# Altium footprint library BIRD.PcbLib: 23 footprints (part 1 of 2)
Each footprint in its own frame and in the unit in brackets; x right, y up, seen from the top. Pads: shape width x height; smd on the part's side, far side on the other; paste and mask are expansions set on the pad; w line width, h text height; cw(c..) or ccw(c..) is an arc to the next point about the centre after c.
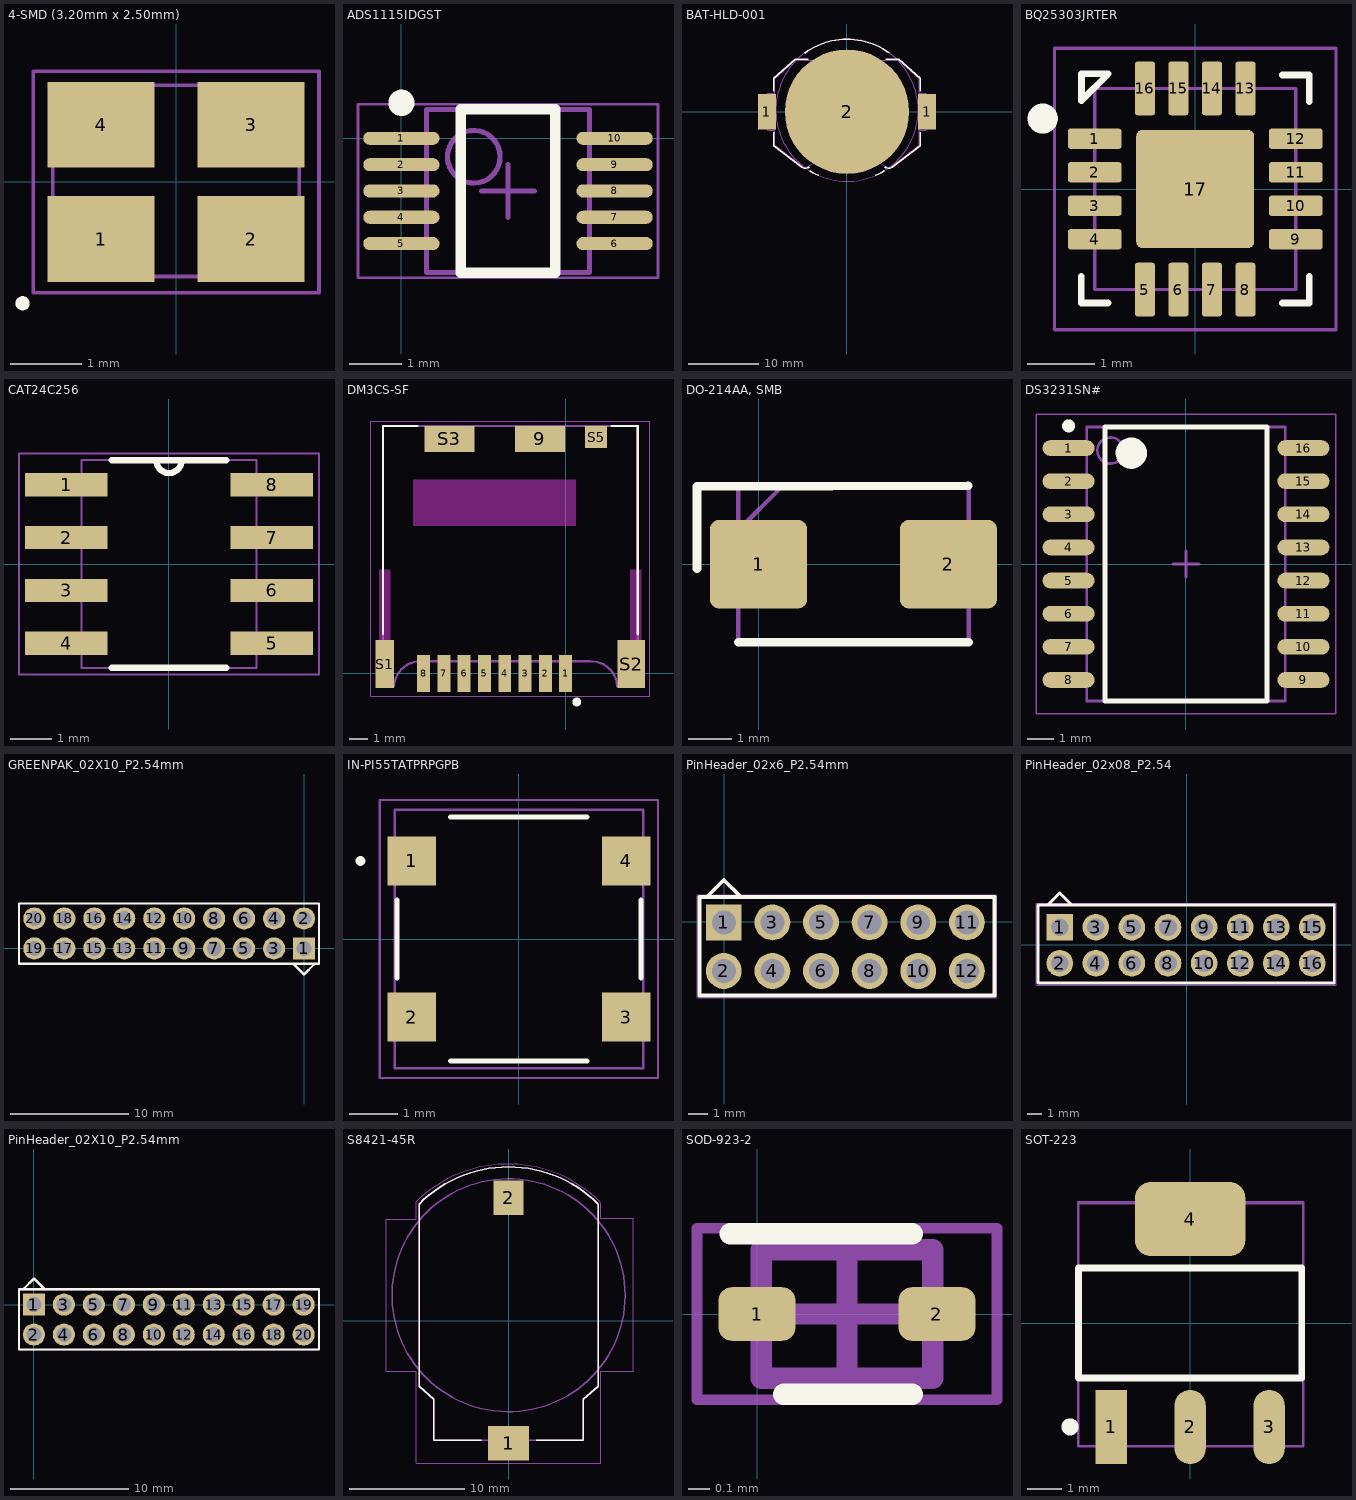
[diagram p0: the footprints below, top view; thin cyan lines are the x and y axes]

## 4-SMD (3.20mm x 2.50mm) [mm] "Crystal :  0.126\" L x 0.098\" W (3.20mm x 2.50mm)"
pads (4):
  rect 1.5x1.2 smd: 1(-1.05,-0.8) 2(1.05,-0.8) 3(1.05,0.8) 4(-1.05,0.8)
Top Overlay:
  lines w0.1: -2.15,-1.75 cw(c-2.15,-1.7) -2.15,-1.65 cw(c-2.15,-1.7) -2.15,-1.75
Mechanical 13:
  lines w0.05: -1.725,-1.325 1.725,-1.325 1.725,1.35 -1.725,1.35 -1.725,-1.325
Mechanical 15:
  lines w0.05: -2,-1.55 2,-1.55 2,1.55 -2,1.55 -2,-1.55
3D body "FL2500047.stp": height 0.88, standoff 0, extent -1.68,-1.28 1.68,1.28

## ADS1115IDGST [mm]
pads (10):
  oval 1.45x0.25 smd: 1(0,0) 2(0,-0.5) 3(0,-1) 4(0,-1.5) 5(0,-2) 6(4.05,-2) 7(4.05,-1.5) 8(4.05,-1) 9(4.05,-0.5) 10(4.05,0)
Top Overlay:
  circle w0.25: c0,0.675 r0.125
  lines w0.2: 1.125,-2.55 2.925,-2.55 2.925,0.55 1.125,0.55 1.125,-2.55
Mechanical 13:
  circle w0.1: c1.375,-0.35 r0.5
  lines w0.1: 0.475,-2.55 3.575,-2.55 3.575,0.55 0.475,0.55 0.475,-2.55
Mechanical 15:
  lines w0.05: -0.825,-2.65 4.875,-2.65 4.875,0.65 -0.825,0.65 -0.825,-2.65
  lines w0.1: 1.525,-1 2.525,-1 ; 2.025,-1.5 2.025,-0.5
3D body "ADS1115IDGST.STEP": height 1.1, standoff 0, extent -0.35,-2.5 4.55,0.5

## BAT-HLD-001 [mm] "BATT RETAINER COIN 20MM 1CEL SMD"
pads (3):
  rect 2.54x5.08 smd: 1(-11.43,0) 1(11.43,0)
  round 17.78 smd: 2(0,0)
Top Overlay:
  lines w0.2: -10.466,-2.94 -10.466,-4.853 -6.545,-7.854 ; -10.466,2.94 -10.466,4.785 -7.425,7.475 -5.515,7.476 ; -6.545,-7.854 ccw(c-5.97,-7.277) -5.561,-7.982 cw(c0.254,-19.539) -5.394,-7.899 ; -6.041,8.364 cw(c0,0.19) 5.977,8.411 ; -5.313,-8.454 ccw(c0,0.215) -4.054,-9.109 ; 4.054,-9.109 ccw(c0,0.215) 5.313,-8.454 ; 5.394,-7.899 cw(c-0.254,-19.539) 5.561,-7.982 ccw(c5.97,-7.277) 6.545,-7.854 ; 5.515,7.476 7.425,7.475 10.466,4.785 10.466,2.94 ; 6.545,-7.854 10.466,-4.853 ; 10.466,-4.852 10.466,-2.94
Mechanical 1:
  circle w0.1: c0,0.215 r10.168
Mechanical 13:
  lines w0.1: -10.326,-2.625 -11.316,-2.625 -11.316,-0.525 -10.316,-0.525 ; -10.316,0.525 -11.316,0.525 -11.316,2.625 -10.316,2.625 ; -6.038,-8.055 cw(c-0.031,-19.513) 6.013,-8.074 ; -6.038,-8.056 -10.316,-4.775 -10.316,4.725 -7.366,7.325 7.366,7.325 10.316,4.725 10.316,-4.775 6.013,-8.075 ; 10.316,-0.525 11.316,-0.525 11.316,-2.625 10.326,-2.625 ; 10.316,0.525 11.316,0.525 11.316,2.625 10.316,2.625
Mechanical 15:
  lines w0.1: -0.5,0 0.5,0 ; 0,-0.5 0,0.5
3D body: height 4, standoff 0, extent -10.148,-9.872 10.148,10.383
3D body: height 4.3, standoff 0, extent -10.317,-8.075 10.317,7.326

## BQ25303JRTER [mm] "Battery Management Standalone 1-cell 17-V, 3.0-A battery charger with JEITA battery temperature monitoring 16-WQFN -40 to 85"
pads (17):
  rrect25% 0.8x0.3 smd mask+0.05: 1(-1.5,0.75) 2(-1.5,0.25) 3(-1.5,-0.25) 4(-1.5,-0.75) 9(1.5,-0.75) 10(1.5,-0.25) 11(1.5,0.25) 12(1.5,0.75)
  rrect25% 0.3x0.8 smd mask+0.05: 5(-0.75,-1.5) 6(-0.25,-1.5) 7(0.25,-1.5) 8(0.75,-1.5) 13(0.75,1.5) 14(0.25,1.5) 15(-0.25,1.5) 16(-0.75,1.5)
  rrect10% 1.76x1.76 smd mask+0.05: 17(0,0)
Top Overlay:
  circle w0.25: c-2.275,1.05 r0.1
  lines w0.1: -1.7,-1.3 -1.7,-1.7 -1.3,-1.7 ; 1.3,-1.7 1.7,-1.7 1.7,-1.3 ; 1.3,1.7 1.7,1.7 1.7,1.3 ; -1.698,1.318 -1.698,1.718 -1.298,1.718 -1.698,1.318
Mechanical 13:
  lines w0.05: -1.5,-1.5 1.5,-1.5 1.5,1.5 -1.5,1.5 -1.5,-1.5
Mechanical 15:
  lines w0.05: -2.1,-2.1 2.1,-2.1 2.1,2.1 -2.1,2.1 -2.1,-2.1
3D body "BQ25303JRTER.stp": height 0.8, standoff 0, extent -1.5,-1.5 1.5,1.5

## CAT24C256 [mil] "The CAT24C256 is a EEPROM Serial 256-Kb I2C, internally organized as 512 pages of 64 bytes each, for a total of 32,768 bytes of 8 bits each"
pads (8):
  rect 78x22 smd: 1(-97,75) 2(-97,25) 3(-97,-25) 4(-97,-75) 5(97,-75) 6(97,-25) 7(97,25) 8(97,75)
Top Overlay:
  lines w6: -54,-98 54,-98 ; -54,98 -12,98 ; 54,98 12,98 ; -12,98 ccw(c0,98) 12,98 ; -12,98 12,98
Mechanical 13:
  lines w0: -122,-85 -79,-85 -79,-65 -122,-65 -122,-85 ; -122,-35 -79,-35 -79,-15 -122,-15 -122,-35 ; -122,15 -79,15 -79,35 -122,35 -122,15 ; -122,65 -79,65 -79,85 -122,85 -122,65 ; -12,98 ccw(c0,98) 12,98 -12,98 ; 79,-85 122,-85 122,-65 79,-65 79,-85 ; 79,-35 122,-35 122,-15 79,-15 79,-35 ; 79,15 122,15 122,35 79,35 79,15 ; 79,65 122,65 122,85 79,85 79,65
  lines w1.97: -82.68,-98.43 82.68,-98.43 82.68,98.43 -82.68,98.43 -82.68,-98.43
Mechanical 15:
  lines w1.97: -141.73,-104.33 141.73,-104.33 141.73,104.33 -141.73,104.33 -141.73,-104.33
3D body "CAT24C256WI.STEP": height 68.9, standoff 0, extent -118.11,-96.46 118.11,96.46

## DM3CS-SF [mm] "10 (8 + 2) Position Card Connector Secure Digital - microSD™ Surface Mount, Right Angle Gold"
pads (13):
  rect 0.7x2 smd: 1(0,0) 2(-1.1,0) 3(-2.2,0) 4(-3.3,0) 5(-4.4,0) 6(-5.5,0) 7(-6.6,0) 8(-7.7,0)
  rect 2.7x1.4 smd: 9(-1.4,12.7) S3(-6.3,12.7)
  rect 1x2.6 smd: S1(-9.8,0.5)
  rect 1.5x2.6 smd: S2(3.55,0.5)
  rect 1.2x1.2 smd: S5(1.65,12.8)
Top Overlay:
  circle w0.24: c0.6,-1.55 r0.12
  lines w0.127: -9.9,2.15 -9.9,13.4 -8.026,13.4 ; 2.5,13.4 3.9,13.4 3.9,2.15
Keep-Out Layer:
  region: 4.1,1.792 3.512,1.792 3.512,5.6 4.1,5.6
  region: -9.5,1.792 -10.112,1.792 -10.112,5.6 -9.5,5.6
  region: 4.1,1.794 3.509,1.794 3.509,5.6 4.1,5.6
  region: -9.5,1.792 -10.112,1.792 -10.112,5.6 -9.5,5.6
  region: 0.55,8.001 -8.253,8.001 -8.253,10.5 0.55,10.5
  region: 0.55,8 -8.251,8 -8.251,10.5 0.55,10.5
Mechanical 13:
  lines w0.127: -9.9,-0.7 -9.9,13.4 3.9,13.4 3.9,-0.7 2.8,-0.7 ccw(c1.375,-0.775) 1.3,0.65 -7.8,0.65 ccw(c-7.875,-0.775) -9.3,-0.7 -9.9,-0.7
Mechanical 15:
  lines w0.05: -10.55,-1.25 4.55,-1.25 4.55,13.65 -10.55,13.65 -10.55,-1.25
3D body "DM3CS-SF.STEP": height 2.13, standoff 0, extent -9.9,-0.525 3.9,13.575

## DO-214AA, SMB [mm]
pads (2):
  rrect20% 2.25x2.05 smd mask+0.102: 1(0,0) 2(4.4,0)
Top Overlay:
  lines w0.2: -1.425,-0.1 -1.425,1.8 4.854,1.819 ; -0.47,-1.81 4.87,-1.81
Mechanical 15:
  lines w0.1: -0.47,0.785 0.555,1.81 ; -0.47,-1.81 -0.47,1.81 4.87,1.81 4.87,-1.81 -0.47,-1.81
3D body "RBR3LB40CTBR1.stp": height 2.45, standoff 0, extent -0.42,-1.81 4.92,1.81

## DS3231SN# [mm] "Extremely Accurate I²C-Integrated RTC/TCXO/Crystal"
pads (16):
  oval 2x0.6 smd: 1(-4.5,4.445) 2(-4.5,3.175) 3(-4.5,1.905) 4(-4.5,0.635) 5(-4.5,-0.635) 6(-4.5,-1.905) 7(-4.5,-3.175) 8(-4.5,-4.445) 9(4.5,-4.445) 10(4.5,-3.175) 11(4.5,-1.905) 12(4.5,-0.635) 13(4.5,0.635) 14(4.5,1.905) 15(4.5,3.175) 16(4.5,4.445)
Top Overlay:
  circle w0.6: c-2.1,4.25 r0.3
  circle w0.25: c-4.5,5.295 r0.125
  lines w0.2: -3.1,-5.25 3.1,-5.25 3.1,5.25 -3.1,5.25 -3.1,-5.25
Mechanical 13:
  circle w0.1: c-2.9,4.35 r0.5
  lines w0.1: -3.8,-5.25 3.8,-5.25 3.8,5.25 -3.8,5.25 -3.8,-5.25
Mechanical 15:
  lines w0.05: -5.75,-5.75 5.75,-5.75 5.75,5.75 -5.75,5.75 -5.75,-5.75
  lines w0.1: -0.5,0 0.5,0 ; 0,-0.5 0,0.5
3D body "DS3231SN#.STEP": height 2.65, standoff 0, extent -5.162,-5.15 5.162,5.15

## GREENPAK_02X10_P2.54mm [mm]
pads (20):
  rect 1.875x1.875 hole 1.25: 1(0,0)
  round 1.875 hole 1.25: 2(0,2.54) 3(-2.54,0) 4(-2.54,2.54) 5(-5.08,0) 6(-5.08,2.54) 7(-7.62,0) 8(-7.62,2.54) 9(-10.16,0) 10(-10.16,2.54) 11(-12.7,0) 12(-12.7,2.54) 13(-15.24,0) 14(-15.24,2.54) 15(-17.78,0) 16(-17.78,2.54) 17(-20.32,0) 18(-20.32,2.54) 19(-22.86,0) 20(-22.86,2.54)
Top Overlay:
  lines w0.2: -0.838,-1.372 0,-2.21 0.864,-1.346 ; 1.26,-1.305 1.27,-1.305 ; 1.27,-1.305 1.27,3.81 -24.165,3.81 -24.165,-1.305 1.27,-1.305
Mechanical 15:
  lines w0.1: -24.13,-1.27 -24.13,3.81 1.27,3.81 1.27,-1.27 -24.13,-1.27
3D body "929852-01-10-RB.stp": height 8.26, standoff -3.18, extent -24.13,-1.27 1.27,3.81
3D body "GreenPak-SKT.step": height 56.32, standoff 2.78, extent -29.506,-1.533 7.764,18.72

## IN-PI55TATPRPGPB [mm] "Standard LEDs - SMD Top View PLCC 5.0x5.0x1.6 4-pin Tricolor with IC"
pads (4):
  rect 1x1 smd: 1(-2.2,1.6) 2(-2.2,-1.6) 3(2.2,-1.6) 4(2.2,1.6)
Top Overlay:
  lines w0.1: -2.5,-0.8 -2.5,0.8 ; -1.4,-2.5 1.4,-2.5 ; -1.4,2.5 1.4,2.5 ; 2.5,-0.8 2.5,0.8 ; -3.3,1.6 ccw(c-3.25,1.6) -3.2,1.6 ccw(c-3.25,1.6) -3.3,1.6
Top Courtyard:
  lines w0.05: -2.85,-2.85 2.85,-2.85 2.85,2.85 -2.85,2.85 -2.85,-2.85
Mechanical 13:
  lines w0.05: -2.55,-2.65 2.55,-2.65 2.55,2.65 -2.55,2.65 -2.55,-2.65
3D body "IN-PI55TATPRPGPB.stp": height 1.7, standoff 0, extent -2.6,-2.5 2.6,2.5

## PinHeader_02x6_P2.54mm [mm] "PinHeader_02x6_P2.54mm"
pads (12):
  rect 1.875x1.875 hole 1.25: 1(-0.025,-0.025)
  round 1.875 hole 1.25: 2(-0.025,-2.565) 3(2.515,-0.025) 4(2.515,-2.565) 5(5.055,-0.025) 6(5.055,-2.565) 7(7.595,-0.025) 8(7.595,-2.565) 9(10.135,-0.025) 10(10.135,-2.565) 11(12.675,-0.025) 12(12.675,-2.565)
Top Overlay:
  lines w0.2: -1.3,-3.85 14.125,-3.85 14.125,1.3 -1.3,1.3 ; -1.295,-3.835 -1.295,1.28 ; -0.889,1.321 -0.025,2.185 0.813,1.347
Top Courtyard:
  lines w0.05: -1.425,-3.975 14.25,-3.975 14.25,1.425 -1.425,1.425 -1.425,-3.975
Mechanical 13:
  lines w0.05: -1.325,-3.85 14.1,-3.85 14.1,1.3 -1.325,1.3 -1.325,-3.85
Mechanical 15:
  lines w0.1: -1.295,-3.835 -1.295,1.245
3D body "Pin Header 2x6 TH Pitch 2.54mm.stp": height 9.5, standoff -3.2, extent -1.195,-3.85 14.045,1.23

## PinHeader_02x08_P2.54 [mm] "PinHeader_02x08_P2.54"
pads (16):
  rect 1.875x1.875 hole 1.25: 1(-8.925,1.225)
  round 1.875 hole 1.25: 2(-8.925,-1.315) 3(-6.385,1.225) 4(-6.385,-1.315) 5(-3.845,1.225) 6(-3.845,-1.315) 7(-1.305,1.225) 8(-1.305,-1.315) 9(1.235,1.225) 10(1.235,-1.315) 11(3.775,1.225) 12(3.775,-1.315) 13(6.315,1.225) 14(6.315,-1.315) 15(8.855,1.225) 16(8.855,-1.315)
Top Overlay:
  lines w0.2: -9.789,2.771 -8.925,3.635 -8.087,2.797 ; -10.45,-2.7 10.4,-2.7 10.4,2.775 -10.45,2.775 -10.45,-2.7
Top Courtyard:
  lines w0.05: -10.6,-2.85 10.525,-2.85 10.525,2.925 -10.6,2.925 -10.6,-2.85
3D body "Pin Header 2x8 TH Pitch 2.54mm.stp": height 9.5, standoff -3.2, extent -10.135,-2.505 10.185,2.575

## PinHeader_02X10_P2.54mm [mm]
pads (20):
  rect 1.875x1.875 hole 1.25: 1(0,0)
  round 1.875 hole 1.25: 2(0,-2.54) 3(2.54,0) 4(2.54,-2.54) 5(5.08,0) 6(5.08,-2.54) 7(7.62,0) 8(7.62,-2.54) 9(10.16,0) 10(10.16,-2.54) 11(12.7,0) 12(12.7,-2.54) 13(15.24,0) 14(15.24,-2.54) 15(17.78,0) 16(17.78,-2.54) 17(20.32,0) 18(20.32,-2.54) 19(22.86,0) 20(22.86,-2.54)
Top Overlay:
  lines w0.2: -1.26,1.305 -1.27,1.305 ; -0.864,1.346 0,2.21 0.838,1.372 ; -1.27,1.305 -1.27,-3.81 24.165,-3.81 24.165,1.305 -1.27,1.305
Mechanical 15:
  lines w0.1: -1.27,-3.81 24.13,-3.81 24.13,1.27 -1.27,1.27 -1.27,-3.81
3D body "TSW-110-07-S-D.stp": height 10.67, standoff -2.79, extent -1.27,-3.81 24.13,1.27

## S8421-45R [mm] "Battery Holder"
pads (2):
  rect 3.6x3 smd: 1(0,-10.7)
  rect 2.6x3 smd: 2(0,10.7)
Top Overlay:
  lines w0.127: -7.8,10.14 -7.8,-5.74 -6.5,-6.86 -6.5,-10.44 -2.4,-10.44 ; -7.8,10.15 cw(c0,2.35) 7.8,10.15 ; 2.4,-10.44 6.5,-10.44 6.5,-6.86 7.8,-5.74 7.8,10.14
Mechanical 13:
  circle w0.127: c0,2.2 r10.15
  lines w0.127: -7.8,10.14 -7.8,-5.74 -6.5,-6.86 -6.5,-10.44 6.5,-10.44 6.5,-6.86 7.8,-5.74 7.8,10.14 ; -7.8,10.15 cw(c0,2.35) 7.8,10.15
Mechanical 15:
  lines w0.05: -8.1,10.3 cw(c-0.05,2.25) 8,10.3 ; -8.05,10.35 -8.05,8.8 -10.65,8.8 -10.65,-4.4 -8.05,-4.4 -8.05,-12.45 8.05,-12.45 8.05,-4.4 10.85,-4.4 10.85,8.9 8.05,8.9 8.05,10.25
3D body "S8421-45R.stp": height 5.4, standoff 0, extent -7.798,-11.2 7.798,13.438

## SOD-923-2 [mm]
pads (2):
  rrect50% 0.36x0.25 smd: 1(0,0) 2(0.84,0)
Top Overlay:
  lines w0.1: -0.125,0.375 0.725,0.375 ; 0.125,-0.375 0.725,-0.375
Mechanical 13:
  lines w0.1: 0.02,-0.3 0.02,0.3 0.82,0.3 0.82,-0.3 0.02,-0.3
Mechanical 15:
  lines w0.05: -0.28,-0.4 -0.28,0.4 1.12,0.4 1.12,-0.4 -0.28,-0.4
  lines w0.1: 0.17,0 0.67,0 ; 0.42,-0.25 0.42,0.25
3D body: height 0.4, standoff 0, extent 0.02,-0.3 0.82,0.3
3D body "ESD9B5.0ST5G.stp": height 0.4, standoff 0, extent -0.075,-0.3 0.925,0.3

## SOT-223 [mm]
pads (4):
  rect 0.912x2.16 smd paste+0 mask+0: 1(-2.3,-3.026)
  rrect100% 0.912x2.16 smd paste+0 mask+0: 2(0,-3.026) 3(2.3,-3.026)
  rrect42% 3.212x2.16 smd paste+0 mask+0: 4(0,3.026)
Top Overlay:
  circle w0.25: c-3.5,-3.026 r0.125
  lines w0.2: -3.25,-1.6 3.25,-1.6 3.25,1.6 -3.25,1.6 -3.25,-1.6
Mechanical 13:
  lines w0.05: -3.25,-3.575 -3.25,3.475 3.275,3.475 3.275,-3.575 -3.25,-3.575
Mechanical 15:
  lines w0.05: -3.275,-3.6 3.3,-3.6 3.3,3.525 -3.275,3.525 -3.275,-3.6
3D body "ZXMP6A17GTA.STEP": height 1.65, standoff 0, extent -3.225,-3.55 3.275,3.45